# Altium footprint library Connectors.PcbLib: 67 footprints (part 3 of 5)
Each footprint in its own frame and in the unit in brackets; x right, y up, seen from the top. Pads: shape width x height; smd on the part's side, far side on the other; paste and mask are expansions set on the pad; w line width, h text height; cw(c..) or ccw(c..) is an arc to the next point about the centre after c.
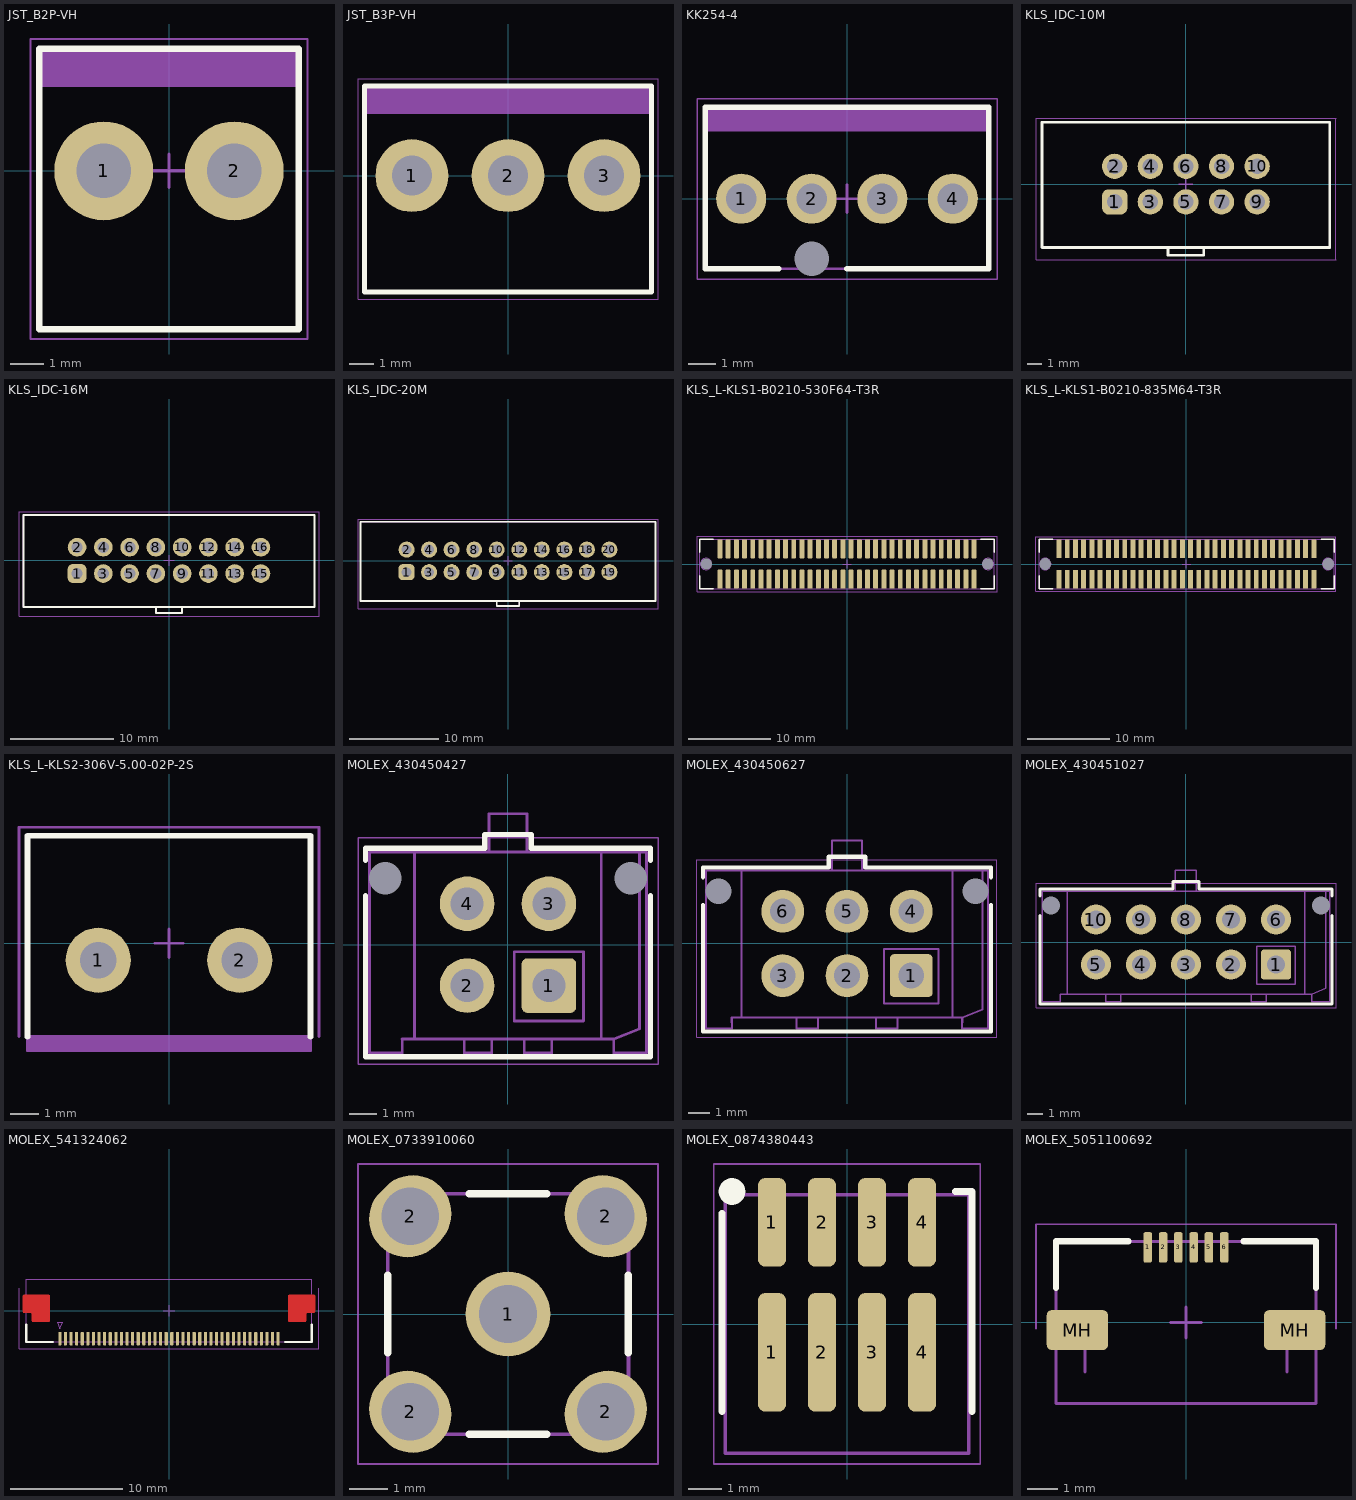
[diagram p2: the footprints below, top view; thin cyan lines are the x and y axes]

## JST_B2P-VH [mm]
pads (2):
  round 3 hole 1.65: 1(-1.98,0) 2(1.98,0)
Top Overlay:
  lines w0.2: -3.93,-4.8 -3.93,3.7 3.93,3.7 3.93,-4.8 -3.93,-4.8
Top Assembly:
  region: -3.93,2.6 -3.93,3.7 3.93,3.7 3.93,2.6
  lines w0.1: -3.93,2.6 3.93,2.6 ; -3.93,-4.8 -3.93,3.7 3.93,3.7 3.93,-4.8 -3.93,-4.8
  text ".Designator" at -5.835,-0.571 h1.6
Top Courtyard (Mech13):
  lines w0.05: -4.2,-5.1 -4.2,4 4.2,4 4.2,-5.1 -4.2,-5.1
  lines w0.1: -0.5,0 0.5,0 ; 0,-0.5 0,0.5
3D body "User Library-B2P-VH.X_T": height 10.9, standoff -3.7, extent -3.93,-4.8 3.93,3.7

## JST_B3P-VH [mm]
pads (3):
  round 3 hole 1.65: 1(-3.96,0) 2(0,0) 3(3.96,0)
Top Overlay:
  lines w0.2: -5.91,-4.8 -5.91,3.7 5.91,3.7 5.91,-4.8 -5.91,-4.8
Top Assembly:
  region: -5.91,2.6 -5.91,3.7 5.91,3.7 5.91,2.6
  lines w0.1: -5.91,2.6 5.91,2.6 ; -5.91,-4.8 -5.91,3.7 5.91,3.7 5.91,-4.8 -5.91,-4.8
  text ".Designator" at -5.835,-0.571 h1.6
Top Courtyard (Mech13):
  lines w0.05: -6.18,-5.1 -6.18,4 6.18,4 6.18,-5.1 -6.18,-5.1
  lines w0.1: -0.5,0 0.5,0 ; 0,-0.5 0,0.5
3D body "User Library-B3P-VH.STEP": height 10.9, standoff -3.7, extent -5.91,-4.8 5.91,3.7

## KK254-4 [mm]
pads (5):
  round 0 hole 1.25 unplated mask+0.05: 0(-1.27,-2.16)
  round 1.8 hole 1.1 mask+0.05: 1(-3.81,0) 2(-1.27,0) 3(1.27,0) 4(3.81,0)
Top Overlay:
  lines w0.2: -2.45,-2.525 -5.1,-2.525 -5.1,3.3 5.1,3.3 5.1,-2.525 0,-2.525
Top Assembly:
  region: -5.1,3.3 -5.1,2.475 5.1,2.475 5.1,3.3
  lines w0.1: -5.1,2.475 5.1,2.475 ; -5.1,-2.525 -5.1,3.3 5.1,3.3 5.1,-2.525 -5.1,-2.525
  text ".Designator" at -5.835,-0.571 h1.6
Top Courtyard (Mech13):
  lines w0.05: -5.4,-2.9 -5.4,3.6 5.4,3.6 5.4,-2.9 -5.4,-2.9
  lines w0.1: -0.5,0 0.5,0 ; 0,-0.5 0,0.5
3D body "470531000.stp": height 10.34, standoff -3.16, extent -5.1,-2.54 5.1,3.3

## KLS_IDC-10M [mm]
pads (10):
  rrect50% 1.8x1.8 hole 1.1 mask+0.05: 1(-5.08,-1.27)
  round 1.8 hole 1.1 mask+0.05: 2(-5.08,1.27) 3(-2.54,-1.27) 4(-2.54,1.27) 5(0,-1.27) 6(0,1.27) 7(2.54,-1.27) 8(2.54,1.27) 9(5.08,-1.27) 10(5.08,1.27)
Top Overlay:
  lines w0.2: -1.27,-4.572 -1.27,-5.08 1.27,-5.08 1.27,-4.572 ; -10.255,-4.52 10.255,-4.52 10.255,4.405 -10.255,4.405 -10.255,-4.52
Top Assembly:
  lines w0.1: -1.27,-4.572 -1.27,-5.08 1.27,-5.08 1.27,-4.572 ; -10.255,-4.52 10.255,-4.52 10.255,4.405 -10.255,4.405 -10.255,-4.52
  text ".Designator" at -5.835,-0.571 h1.6
Top Courtyard (Mech13):
  lines w0.05: 10.69,-5.4 10.69,4.7 ; 10.7,-5.4 -10.69,-5.4 -10.69,4.7 10.7,4.7
  lines w0.1: -0.5,0 0.5,0 ; 0,-0.5 0,0.5
3D body "User Library-IDC-10M.X_T": height 9.3, standoff -3.1, extent -10.15,-4.55 10.15,4.55

## KLS_IDC-16M [mm]
pads (16):
  rrect50% 1.8x1.8 hole 1.1 mask+0.05: 1(-8.89,-1.27)
  round 1.8 hole 1.1 mask+0.05: 2(-8.89,1.27) 3(-6.35,-1.27) 4(-6.35,1.27) 5(-3.81,-1.27) 6(-3.81,1.27) 7(-1.27,-1.27) 8(-1.27,1.27) 9(1.27,-1.27) 10(1.27,1.27) 11(3.81,-1.27) 12(3.81,1.27) 13(6.35,-1.27) 14(6.35,1.27) 15(8.89,-1.27) 16(8.89,1.27)
Top Overlay:
  lines w0.2: -1.27,-4.572 -1.27,-5.08 1.27,-5.08 1.27,-4.572 ; -14.065,-4.52 -14.065,4.405 14.065,4.405 14.065,-4.52 -14.065,-4.52
Top Assembly:
  lines w0.1: -1.27,-4.572 -1.27,-5.08 1.27,-5.08 1.27,-4.572 ; -14.065,-4.52 -14.065,4.405 14.065,4.405 14.065,-4.52 -14.065,-4.52
  text ".Designator" at -5.835,-0.571 h1.6
Top Courtyard (Mech13):
  lines w0.05: -14.5,-5.4 -14.5,4.7 14.5,4.7 14.5,-5.4 -14.5,-5.4
  lines w0.1: -0.5,0 0.5,0 ; 0,-0.5 0,0.5
3D body "User Library-DS1013-16S (IDC-16MS CONNFLY).x_t": height 9, standoff -3.6, extent -14.06,-4.5 14.06,4.4

## KLS_IDC-20M [mm]
pads (20):
  rrect50% 1.8x1.8 hole 1.1 mask+0.05: 1(-11.43,-1.27)
  round 1.8 hole 1.1 mask+0.05: 2(-11.43,1.27) 3(-8.89,-1.27) 4(-8.89,1.27) 5(-6.35,-1.27) 6(-6.35,1.27) 7(-3.81,-1.27) 8(-3.81,1.27) 9(-1.27,-1.27) 10(-1.27,1.27) 11(1.27,-1.27) 12(1.27,1.27) 13(3.81,-1.27) 14(3.81,1.27) 15(6.35,-1.27) 16(6.35,1.27) 17(8.89,-1.27) 18(8.89,1.27) 19(11.43,-1.27) 20(11.43,1.27)
Top Overlay:
  lines w0.2: -1.27,-4.572 -1.27,-5.08 1.27,-5.08 1.27,-4.572 ; -16.605,-4.52 -16.605,4.405 16.62,4.405 16.62,-4.52 -16.605,-4.52
Top Assembly:
  lines w0.1: -1.27,-4.572 -1.27,-5.08 1.27,-5.08 1.27,-4.572 ; -16.605,-4.52 16.62,-4.52 16.62,4.405 -16.605,4.405 -16.605,-4.52
  text ".Designator" at -5.835,-0.571 h1.6
Top Courtyard (Mech13):
  lines w0.05: -16.9,-5.4 16.9,-5.4 16.9,4.7 -16.9,4.7 -16.9,-5.4
  lines w0.1: -0.5,0 0.5,0 ; 0,-0.5 0,0.5
3D body "User Library-DS1013-20S (IDC-20MS CONNFLY).x_t": height 9, standoff -3.6, extent -16.6,-4.5 16.6,4.4

## KLS_L-KLS1-B0210-530F64-T3R [mm]
height 5.3
pads (66):
  rrect25% 0.6x2.3 smd mask+0.05: 1(-15.5,1.85) 2(-15.5,-1.85) 3(-14.5,1.85) 4(-14.5,-1.85) 5(-13.5,1.85) 6(-13.5,-1.85) 7(-12.5,1.85) 8(-12.5,-1.85) 9(-11.5,1.85) 10(-11.5,-1.85) 11(-10.5,1.85) 12(-10.5,-1.85) 13(-9.5,1.85) 14(-9.5,-1.85) 15(-8.5,1.85) 16(-8.5,-1.85) 17(-7.5,1.85) 18(-7.5,-1.85) 19(-6.5,1.85) 20(-6.5,-1.85) 21(-5.5,1.85) 22(-5.5,-1.85) 23(-4.5,1.85) 24(-4.5,-1.85) 25(-3.5,1.85) 26(-3.5,-1.85) 27(-2.5,1.85) 28(-2.5,-1.85) 29(-1.5,1.85) 30(-1.5,-1.85) 31(-0.5,1.85) 32(-0.5,-1.85) 33(0.5,1.85) 34(0.5,-1.85) 35(1.5,1.85) 36(1.5,-1.85) 37(2.5,1.85) 38(2.5,-1.85) 39(3.5,1.85) 40(3.5,-1.85) 41(4.5,1.85) 42(4.5,-1.85) 43(5.5,1.85) 44(5.5,-1.85) 45(6.5,1.85) 46(6.5,-1.85) 47(7.5,1.85) 48(7.5,-1.85) 49(8.5,1.85) 50(8.5,-1.85) 51(9.5,1.85) 52(9.5,-1.85) 53(10.5,1.85) 54(10.5,-1.85) 55(11.5,1.85) 56(11.5,-1.85) 57(12.5,1.85) 58(12.5,-1.85) 59(13.5,1.85) 60(13.5,-1.85) 61(14.5,1.85) 62(14.5,-1.85) 63(15.5,1.85) 64(15.5,-1.85)
  round 0 hole 1.4 unplated mask+0.1: MH(-17.2,0) MH(17.2,0)
Top Overlay:
  lines w0.2: -17.95,-1.418 -17.95,-3.023 -16.345,-3.023 ; -17.95,1.422 -17.95,3.027 -16.345,3.027 ; 16.345,-3.023 17.95,-3.023 17.95,-1.418 ; 16.345,3.027 17.95,3.027 17.95,1.422
Top Assembly:
  circle w0.1: c-17.2,0 r0.7
  circle w0.1: c17.2,0 r0.7
  lines w0.1: -17.95,-3.023 17.95,-3.023 17.95,3.027 -17.95,3.027 -17.95,-3.023
  text ".Designator" at -5.835,-0.571 h1.6
Top Courtyard (Mech13):
  lines w0.05: -18.3,-3.4 18.3,-3.4 18.3,3.4 -18.3,3.4 -18.3,-3.4
  lines w0.1: -0.5,0 0.5,0 ; 0,-0.5 0,0.5
3D body "2348-64G30DPN1T-P.step": height 5.42, standoff -0.71, extent -17.95,-3.023 17.95,3.027

## KLS_L-KLS1-B0210-835M64-T3R [mm]
height 8.35
pads (66):
  rrect25% 0.6x2.3 smd mask+0.05: 1(-15.5,-1.85) 2(-15.5,1.85) 3(-14.5,-1.85) 4(-14.5,1.85) 5(-13.5,-1.85) 6(-13.5,1.85) 7(-12.5,-1.85) 8(-12.5,1.85) 9(-11.5,-1.85) 10(-11.5,1.85) 11(-10.5,-1.85) 12(-10.5,1.85) 13(-9.5,-1.85) 14(-9.5,1.85) 15(-8.5,-1.85) 16(-8.5,1.85) 17(-7.5,-1.85) 18(-7.5,1.85) 19(-6.5,-1.85) 20(-6.5,1.85) 21(-5.5,-1.85) 22(-5.5,1.85) 23(-4.5,-1.85) 24(-4.5,1.85) 25(-3.5,-1.85) 26(-3.5,1.85) 27(-2.5,-1.85) 28(-2.5,1.85) 29(-1.5,-1.85) 30(-1.5,1.85) 31(-0.5,-1.85) 32(-0.5,1.85) 33(0.5,-1.85) 34(0.5,1.85) 35(1.5,-1.85) 36(1.5,1.85) 37(2.5,-1.85) 38(2.5,1.85) 39(3.5,-1.85) 40(3.5,1.85) 41(4.5,-1.85) 42(4.5,1.85) 43(5.5,-1.85) 44(5.5,1.85) 45(6.5,-1.85) 46(6.5,1.85) 47(7.5,-1.85) 48(7.5,1.85) 49(8.5,-1.85) 50(8.5,1.85) 51(9.5,-1.85) 52(9.5,1.85) 53(10.5,-1.85) 54(10.5,1.85) 55(11.5,-1.85) 56(11.5,1.85) 57(12.5,-1.85) 58(12.5,1.85) 59(13.5,-1.85) 60(13.5,1.85) 61(14.5,-1.85) 62(14.5,1.85) 63(15.5,-1.85) 64(15.5,1.85)
  round 0 hole 1.4 unplated: MH(-17.155,0) MH(17.245,0)
Top Overlay:
  lines w0.2: -17.905,-1.42 -17.905,-3.025 -16.3,-3.025 ; -17.905,1.42 -17.905,3.025 -16.3,3.025 ; 16.39,-3.025 17.995,-3.025 17.995,-1.42 ; 16.39,3.025 17.995,3.025 17.995,1.42
Top Assembly:
  circle w0.1: c-17.155,0 r0.7
  circle w0.1: c17.245,0 r0.7
  lines w0.1: -17.905,-3.025 -17.905,3.025 17.995,3.025 17.995,-3.025 -17.905,-3.025
  text ".Designator" at -5.835,-0.571 h1.6
Top Courtyard (Mech13):
  lines w0.05: -18.3,-3.3 18.2,-3.3 18.2,3.3 -18.3,3.3 -18.3,-3.3
  lines w0.1: -0.5,0 0.5,0 ; 0,-0.5 0,0.5
3D body "2349-64G00DP3T.STEP": height 8.4, standoff -0.71, extent -17.905,-3.025 17.995,3.025

## KLS_L-KLS2-306V-5.00-02P-2S [mm]
pads (2):
  round 2.3 hole 1.3 mask+0.05: 1(-2.5,-0.6) 2(2.5,-0.6)
Top Overlay:
  lines w0.2: -5,-3.3 -5,3.8 5,3.8 5,-3.3
Top Assembly:
  region: 5,-3.3 5,-3.8 -5,-3.8 -5,-3.3
  lines w0.1: -5,-3.3 5,-3.3 ; -5,-3.8 5,-3.8 5,3.8 -5,3.8 -5,-3.8
  text ".Designator" at -5.835,-0.571 h1.6
Top Courtyard (Mech13):
  lines w0.1: -5.3,-3.3 -5.3,4.1 5.3,4.1 5.3,-3.3 ; -0.5,0 0.5,0 ; 0,-0.5 0,0.5
3D body "DG306-5_0-1.X_T": height 9.8, standoff -3.9, extent -5,-3.8 5,3.8

## MOLEX_430450427 [mm]
height 9.91
pads (6):
  rrect20% 2x2 hole 1.2 mask+0.05: 1(1.5,-1.5)
  round 2 hole 1.2 mask+0.05: 2(-1.5,-1.5) 3(1.5,1.5) 4(-1.5,1.5)
  round 0 hole 1.2 unplated mask+0.1: MH(-4.5,2.44) MH(4.5,2.44)
Top Overlay:
  lines w0.2: -5.225,1.79 -5.225,-4.11 5.225,-4.11 5.225,1.79 ; -5.225,3.09 -5.225,3.54 -0.85,3.54 -0.85,4.04 0.85,4.04 0.85,3.54 5.225,3.54 5.225,3.09
Top Assembly:
  lines w0.1: -3.884,-3.46 -3.425,-3.46 -3.425,-2.48 -3.425,2.62 -3.425,3.4 ; -1.6,-3.46 -1.6,-3.97 -0.6,-3.97 -0.6,-3.46 ; -0.7,3.4 -0.7,4.8 0.7,4.8 0.7,3.4 ; 0.6,-3.46 0.6,-3.97 1.6,-3.97 1.6,-3.46 ; 3.416,-3.46 3.416,3.4 ; 3.875,-3.46 3.875,-3.97 5.075,-3.97 5.075,3.4 -5.075,3.4 -5.075,-3.97 -3.875,-3.97 -3.875,-3.46 3.425,-3.46 3.884,-3.46 4.825,-3.08 4.825,3.4 ; 0.23,-2.8 2.77,-2.8 2.77,-0.26 0.23,-0.26 0.23,-2.8
  text ".Designator" at -5.835,-0.571 h1.6
Top Courtyard (Mech13):
  lines w0.05: -5.5,-4.385 5.5,-4.385 5.5,3.915 -5.5,3.915 -5.5,-4.385
3D body "430450427.stp": height 9.95, standoff -3.14, extent -5.075,-3.97 5.075,4.8

## MOLEX_430450627 [mm]
height 9.91
pads (8):
  rrect20% 2x2 hole 1.2 mask+0.05: 1(3,-1.5)
  round 2 hole 1.2 mask+0.05: 2(0,-1.5) 3(-3,-1.5) 4(3,1.5) 5(0,1.5) 6(-3,1.5)
  round 0 hole 1.2 unplated mask+0.1: MH(-6,2.44) MH(6,2.44)
Top Overlay:
  lines w0.2: -6.725,1.79 -6.725,-4.11 6.725,-4.11 6.725,1.79 ; -6.725,3.09 -6.725,3.54 -0.85,3.54 -0.85,4.04 0.85,4.04 0.85,3.54 6.725,3.54 6.725,3.09
Top Assembly:
  lines w0.1: -5.384,-3.46 -4.925,-3.46 ; -5.375,-3.46 -5.375,-3.97 -6.575,-3.97 -6.575,3.4 6.575,3.4 6.575,-3.97 5.375,-3.97 5.375,-3.46 ; -4.925,3.4 -4.925,2.62 -4.925,-2.48 -4.925,-3.46 ; -2.35,-3.46 -2.35,-3.97 -1.35,-3.97 -1.35,-3.46 ; -0.7,3.4 -0.7,4.8 0.7,4.8 0.7,3.4 ; 1.35,-3.46 1.35,-3.97 2.35,-3.97 2.35,-3.46 ; 4.916,-3.46 4.916,3.4 ; 6.325,3.4 6.325,2.62 6.325,1.07 6.325,0.545 6.325,-0.605 6.325,-1.13 6.325,-2.48 6.325,-3.08 5.384,-3.46 4.925,-3.46 -4.925,-3.46 ; 1.73,-2.8 1.73,-0.26 4.27,-0.26 4.27,-2.8 1.73,-2.8
  text ".Designator" at -5.835,-0.571 h1.6
Top Courtyard (Mech13):
  lines w0.05: -7,-4.385 -7,3.915 7,3.915 7,-4.385 -7,-4.385
3D body "430450627.stp": height 9.95, standoff -3.14, extent -6.575,-3.97 6.575,4.8

## MOLEX_430451027 [mm]
height 9.91
pads (12):
  rrect20% 2x2 hole 1.2 mask+0.05: 1(6,-1.5)
  round 2 hole 1.2 mask+0.05: 2(3,-1.5) 3(0,-1.5) 4(-3,-1.5) 5(-6,-1.5) 6(6,1.5) 7(3,1.5) 8(0,1.5) 9(-3,1.5) 10(-6,1.5)
  round 0 hole 1.2 unplated mask+0.1: MH(-9,2.44) MH(9,2.44)
Top Overlay:
  lines w0.2: -9.725,1.79 -9.725,-4.11 9.725,-4.11 9.725,1.79 ; -9.725,3.09 -9.725,3.54 -0.85,3.54 -0.85,4.04 0.85,4.04 0.85,3.54 9.725,3.54 9.725,3.09
Top Assembly:
  lines w0.1: -8.384,-3.46 -7.925,-3.46 ; -8.375,-3.46 -8.375,-3.97 -9.575,-3.97 -9.575,3.4 9.575,3.4 9.575,-3.97 8.375,-3.97 8.375,-3.46 ; -7.925,3.4 -7.925,-3.46 ; -5.35,-3.46 -5.35,-3.97 -4.35,-3.97 -4.35,-3.46 ; -0.7,3.4 -0.7,4.8 0.7,4.8 0.7,3.4 ; 4.35,-3.46 4.35,-3.97 5.35,-3.97 5.35,-3.46 ; 7.925,3.4 7.925,-3.46 ; 9.325,3.4 9.325,2.62 9.325,1.07 9.325,0.545 9.325,-0.605 9.325,-1.13 9.325,-2.48 9.325,-3.08 8.384,-3.46 7.925,-3.46 ; -7.925,-3.46 7.925,-3.46 ; 4.73,-2.8 7.27,-2.8 7.27,-0.26 4.73,-0.26 4.73,-2.8
  text ".Designator" at -5.835,-0.571 h1.6
Top Courtyard (Mech13):
  lines w0.05: -10,-4.385 10,-4.385 10,3.915 -10,3.915 -10,-4.385
3D body "430451027.stp": height 9.91, standoff -3.18, extent -9.575,-3.97 9.575,4.8

## MOLEX_541324062 [mm]
height 2
pads (41):
  rrect50% 0.28x1.2 smd mask+0.05: 1(-9.75,-2.5) 1(-9.75,-2.5) 2(-9.25,-2.5) 3(-8.75,-2.5) 4(-8.25,-2.5) 5(-7.75,-2.5) 6(-7.25,-2.5) 7(-6.75,-2.5) 8(-6.25,-2.5) 9(-5.75,-2.5) 10(-5.25,-2.5) 11(-4.75,-2.5) 12(-4.25,-2.5) 13(-3.75,-2.5) 14(-3.25,-2.5) 15(-2.75,-2.5) 16(-2.25,-2.5) 17(-1.75,-2.5) 18(-1.25,-2.5) 19(-0.75,-2.5) 20(-0.25,-2.5) 21(0.25,-2.5) 22(0.75,-2.5) 23(1.25,-2.5) 24(1.75,-2.5) 25(2.25,-2.5) 26(2.75,-2.5) 27(3.25,-2.5) 28(3.75,-2.5) 29(4.25,-2.5) 30(4.75,-2.5) 31(5.25,-2.5) 32(5.75,-2.5) 33(6.25,-2.5) 34(6.75,-2.5) 35(7.25,-2.5) 36(7.75,-2.5) 37(8.25,-2.5) 38(8.75,-2.5) 39(9.25,-2.5) 40(9.75,-2.5)
Top Layer:
  region: -12.15,-1 -10.75,-1 -10.73,-1 -10.693,-0.985 -10.665,-0.957 -10.65,-0.92 -10.65,-0.9 -10.65,-0.225 -10.65,1.175 -10.65,1.3 -10.65,1.32 -10.665,1.357 -10.693,1.385 -10.73,1.4 -10.75,1.4 -12.95,1.4 -12.97,1.4 -13.007,1.385 -13.035,1.357 -13.05,1.32 -13.05,1.3 -13.05,-0.1 -13.05,-0.12 -13.035,-0.157 -13.007,-0.185 -12.97,-0.2 -12.95,-0.2 -12.35,-0.2 -12.331,-0.202 -12.294,-0.217 -12.267,-0.244 -12.252,-0.28 -12.25,-0.3 -12.25,-0.9 -12.25,-0.92 -12.235,-0.957 -12.207,-0.985 -12.17,-1
  region: 12.15,-1 10.75,-1 10.73,-1 10.693,-0.985 10.665,-0.957 10.65,-0.92 10.65,-0.9 10.65,-0.225 10.65,1.175 10.65,1.3 10.65,1.32 10.665,1.357 10.693,1.385 10.73,1.4 10.75,1.4 12.95,1.4 12.97,1.4 13.007,1.385 13.035,1.357 13.05,1.32 13.05,1.3 13.05,-0.1 13.05,-0.12 13.035,-0.157 13.007,-0.185 12.97,-0.2 12.95,-0.2 12.35,-0.2 12.331,-0.202 12.294,-0.217 12.267,-0.244 12.252,-0.28 12.25,-0.3 12.25,-0.9 12.25,-0.92 12.235,-0.957 12.207,-0.985 12.17,-1
Top Overlay:
  lines w0.2: -12.75,-1.25 -12.75,-2.8 -10.375,-2.8 ; 10.375,-2.8 12.75,-2.8 12.75,-1.25
Top Assembly:
  lines w0.1: -12.75,-2.8 12.75,-2.8 12.75,2.8 -12.75,2.8 -12.75,-2.8 ; -10,-1.025 -9.75,-1.625 -9.5,-1.025 -10,-1.025
  text ".Designator" at -5.835,-0.571 h1.6
Top Courtyard (Mech13):
  lines w0.05: -13.4,2 -13.4,-3.4 13.4,-3.4 13.4,2
  lines w0.1: -0.5,0 0.5,0 ; 0,-0.5 0,0.5
3D body "541044031.stp": height 2.03, standoff -0.02, extent -12.75,-2.8 12.75,2.8

## MOLEX_0733910060 [mm]
height 13.5
pads (5):
  round 2.2 hole 1.5: 1(0,0)
  oval 2x2.2 hole 1.5 rot 45: 2(-2.54,-2.54) 2(2.54,2.54)
  oval 2x2.2 hole 1.5 rot 135: 2(-2.54,2.54) 2(2.54,-2.54)
Top Overlay:
  lines w0.2: -3.125,-1 -3.125,0 -3.125,1 ; -1,-3.125 0,-3.125 1,-3.125 ; -1,3.125 0,3.125 1,3.125 ; 3.125,-1 3.125,0 3.125,1
Top Assembly:
  lines w0.1: -3.128,-3.126 -3.128,3.126 3.129,3.126 3.129,-3.126 -3.128,-3.126
  text ".Designator" at -5.835,-0.571 h1.6
Top Courtyard (Mech13):
  lines w0.05: -3.9,-3.9 -3.9,3.9 3.9,3.9 3.9,-3.9 -3.9,-3.9
  lines w0.1: -0.5,0 0.5,0 ; 0,-0.5 0,0.5
3D body "733910060.stp": height 9.55, standoff -3.95, extent -3.128,-3.126 3.129,3.126

## MOLEX_0874380443 [mm]
pads (8):
  rrect50% 0.85x3.55 smd mask+0.1: 1(-2.25,-0.85) 2(-0.75,-0.85) 3(0.75,-0.85) 4(2.25,-0.85)
  rrect50% 0.85x2.65 smd mask+0.1: 1(-2.25,3.05) 2(-0.75,3.05) 3(0.75,3.05) 4(2.25,3.05)
Top Overlay:
  circle w0.4: c-3.45,3.975 r0.2
  lines w0.2: -3.75,-2.625 -3.75,3.325 ; 3.25,3.975 3.75,3.975 3.75,-2.625
Top Assembly:
  lines w0.1: -3.65,-3.875 -3.65,3.875 3.65,3.875 3.65,-3.875 -3.65,-3.875
  text ".Designator" at -5.835,-0.571 h1.6
Top Courtyard (Mech13):
  lines w0.05: -4,-4.2 -4,4.8 4,4.8 4,-4.2 -4,-4.2
3D body "molex.stp": height 4.52, standoff 0, extent -3.65,-3.875 3.65,3.875

## MOLEX_5051100692 [mm]
pads (8):
  rrect50% 0.28x1 smd mask+0.05: 1(-1.25,2.45) 2(-0.75,2.45) 3(-0.25,2.45) 4(0.25,2.45) 5(0.75,2.45) 6(1.25,2.45)
  rrect25% 2x1.3 smd mask+0.05: MH(-3.55,-0.25) MH(3.55,-0.25)
Top Overlay:
  lines w0.2: -4.25,1.125 -4.25,2.65 -1.875,2.65 ; 1.875,2.65 4.25,2.65 4.25,1.125
Top Assembly:
  lines w0.1: -3.55,-0.375 -3.3,-0.025 ; -3.3,-1.625 -3.3,-0.025 ; -3.05,-0.375 -3.3,-0.025 ; 3.05,-0.375 3.3,-0.025 ; 3.3,-1.625 3.3,-0.025 ; 3.55,-0.375 3.3,-0.025 ; -4.25,-2.65 -4.25,2.65 4.25,2.65 4.25,-2.65 -4.25,-2.65
  text ".Designator" at -5.835,-0.571 h1.6
Top Courtyard (Mech13):
  lines w0.05: -4.9,-0.2 -4.9,3.2 4.9,3.2 4.9,-0.2
  lines w0.1: -0.5,0 0.5,0 ; 0,-0.5 0,0.5
3D body "5051100692.stp": height 1.88, standoff -0.02, extent -4.25,-2.65 4.25,2.65